# Altium footprint library SYB.PcbLib.PcbLib: 89 footprints (part 5 of 6)
Each footprint in its own frame and in the unit in brackets; x right, y up, seen from the top. Pads: shape width x height; smd on the part's side, far side on the other; paste and mask are expansions set on the pad; w line width, h text height; cw(c..) or ccw(c..) is an arc to the next point about the centre after c.
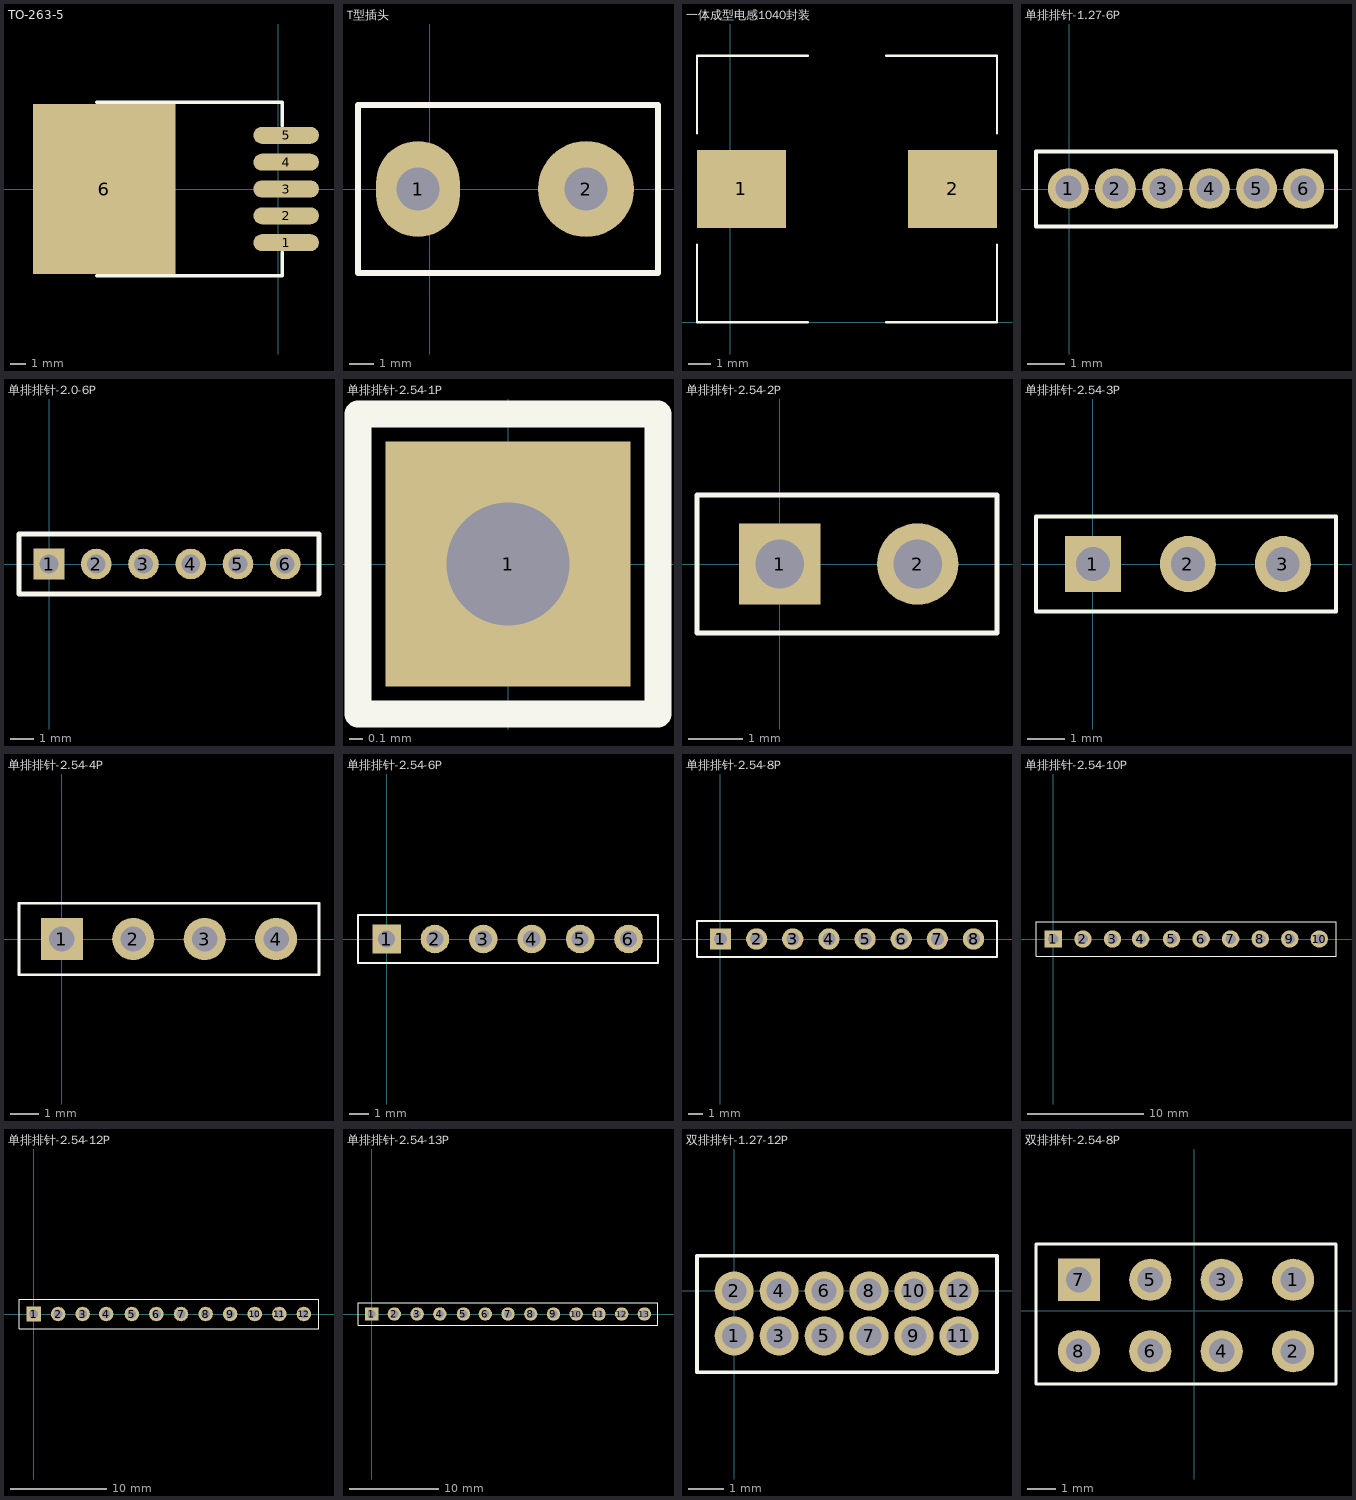
[diagram p4: the footprints below, top view; thin cyan lines are the x and y axes]

## TO-263-5 [mm] "TO-263-5"
pads (6):
  oval 4.16x1.07 smd: 1(0.5,-3.4) 2(0.5,-1.7) 3(0.5,0) 4(0.5,1.7) 5(0.5,3.4)
  rect 9x10.8 smd: 6(-11.025,0)
Top Overlay:
  lines w0.2: -11.5,-5.5 0.25,-5.5 0.25,-5.25 0.25,-4 ; -11.5,5.5 0.25,5.5 0.25,4
3D body: height 4.76, standoff 0.2, extent -13.57,-5.018 0.445,5.142

## T型插头 [mm]
pads (2):
  oval 3.5x4 hole 1.8: 1(-0.5,0)
  round 4 hole 1.8: 2(6.5,0)
Top Overlay:
  lines w0.254: -3,-3.5 -3,3.5 9.5,3.5 9.5,-3.5 -3,-3.5

## 一体成型电感1040封装 [mm]
pads (2):
  rect 4x3.5 smd: 1(0.5,6) 2(10,6)
Top Overlay:
  lines w0.1: -1.5,3.5 -1.5,0 0,0 3.5,0 ; -1.5,8.5 -1.5,12 3.5,12 ; 7,0 12,0 12,3.5 ; 7,12 10,12 12,12 12,8.5

## 单排排针-1.27-6P [mm]
pads (6):
  round 1.1 hole 0.7 unplated: 1(-0.025,0.025) 2(1.245,0.025) 3(2.515,0.025) 4(3.785,0.025) 5(5.055,0.025) 6(6.325,0.025)
Top Overlay:
  lines w0.1: -0.9,-1 7.2,-1 7.2,1.025 -0.9,1.025 -0.9,-1

## 单排排针-2.0-6P [mm]
pads (6):
  rect 1.3x1.3 hole 0.8: 1(0,0)
  round 1.3 hole 0.8: 2(2,0) 3(4,0) 4(6,0) 5(8,0) 6(10,0)
Top Overlay:
  lines w0.2: -1.27,-1.27 11.43,-1.27 11.43,1.27 -1.27,1.27 -1.27,-1.27

## 单排排针-2.54-1P [mm]
pads (1):
  rect 1.8x1.8 hole 0.9: 1(0,0)
Top Overlay:
  lines w0.2: -1.1,-1.1 -1.1,1.1 1.1,1.1 1.1,-1.1 -1.1,-1.1
3D body: height 8.54, standoff -3, extent -1.27,-1.27 1.27,1.27

## 单排排针-2.54-2P [mm]
pads (2):
  rect 1.5x1.5 hole 0.9 unplated: 1(0,0)
  round 1.5 hole 0.9 unplated: 2(2.54,0)
Top Overlay:
  lines w0.1: -1.524,-1.27 4,-1.27 4,1.27 -1.524,1.27 -1.524,-1.27

## 单排排针-2.54-3P [mm]
pads (3):
  rect 1.5x1.5 hole 0.9 unplated: 1(0,0)
  round 1.5 hole 0.9 unplated: 2(2.54,0) 3(5.08,0)
Top Overlay:
  lines w0.1: -1.524,-1.27 6.5,-1.27 6.5,1.27 -1.524,1.27 -1.524,-1.27

## 单排排针-2.54-4P [mm]
pads (4):
  rect 1.5x1.5 hole 0.9 unplated: 1(0,0)
  round 1.5 hole 0.9 unplated: 2(2.54,0) 3(5.08,0) 4(7.62,0)
Top Overlay:
  lines w0.1: -1.524,-1.27 -1.524,1.27 9.144,1.27 9.144,-1.27 -1.524,-1.27

## 单排排针-2.54-6P [mm]
pads (6):
  rect 1.5x1.5 hole 0.9 unplated: 1(0,0)
  round 1.5 hole 0.9 unplated: 2(2.54,0) 3(5.08,0) 4(7.62,0)
  round 1.5 hole 0.9: 5(10.16,0) 6(12.7,0)
Top Overlay:
  lines w0.1: -1.5,-1.27 14.25,-1.27 14.25,1.27 -1.5,1.27 -1.5,-1.27

## 单排排针-2.54-8P [mm]
pads (8):
  rect 1.5x1.5 hole 0.9: 1(0,0)
  round 1.5 hole 0.9: 2(2.54,0) 3(5.08,0) 4(7.62,0) 5(10.16,0) 6(12.7,0) 7(15.24,0) 8(17.78,0)
Top Overlay:
  lines w0.127: -1.651,-1.27 -1.651,1.27 19.431,1.27 19.431,-1.27 -1.651,-1.27

## 单排排针-2.54-10P [mm]
pads (10):
  rect 1.5x1.5 hole 0.9: 1(0,0)
  round 1.5 hole 0.9: 2(2.54,0) 3(5.08,0) 4(7.5,0) 5(10.16,0) 6(12.7,0) 7(15.24,0) 8(17.78,0) 9(20.32,0) 10(22.86,0)
Top Overlay:
  lines w0.1: -1.5,-1.5 -1.5,1.5 24.3,1.5 24.3,-1.5 -1.5,-1.5

## 单排排针-2.54-12P [mm]
pads (12):
  rect 1.5x1.5 hole 0.9: 1(0,0)
  round 1.5 hole 0.9: 2(2.54,0) 3(5.08,0) 4(7.5,0) 5(10.16,0) 6(12.7,0) 7(15.24,0) 8(17.78,0) 9(20.32,0) 10(22.86,0) 11(25.4,0) 12(27.94,0)
Top Overlay:
  lines w0.1: -1.5,-1.5 -1.5,1.5 29.5,1.5 29.5,-1.5 -1.5,-1.5

## 单排排针-2.54-13P [mm]
pads (13):
  rect 1.5x1.5 hole 0.9 unplated: 1(0,0)
  round 1.5 hole 0.9 unplated: 2(2.54,0) 3(5.08,0) 4(7.62,0)
  round 1.5 hole 0.9: 5(10.26,0) 6(12.7,0) 7(15.24,0) 8(17.78,0) 9(20.32,0) 10(22.86,0) 11(25.4,0) 12(27.94,0) 13(30.48,0)
Top Overlay:
  lines w0.1: -1.524,-1.27 -1.524,1.27 32,1.27 32,-1.27 -1.524,-1.27

## 双排排针-1.27-12P [mm]
pads (12):
  round 1.1 hole 0.7 unplated: 1(0,-1.27) 2(0,0) 3(1.27,-1.27) 4(1.27,0) 5(2.54,-1.27) 6(2.54,0) 7(3.81,-1.27) 8(3.81,0) 9(5.08,-1.27) 10(5.08,0) 11(6.35,-1.27) 12(6.35,0)
Top Overlay:
  lines w0.1: -1.05,-2.3 -1.05,1 7.425,1 7.425,-2.3 -1.05,-2.3

## 双排排针-2.54-8P [mm]
pads (8):
  round 1.5 hole 0.9 unplated: 1(3.52,1.1) 2(3.52,-1.44) 3(0.98,1.1) 4(0.98,-1.44) 5(-1.56,1.1) 6(-1.56,-1.44) 8(-4.1,-1.44)
  rect 1.5x1.5 hole 0.9 unplated: 7(-4.1,1.1)
Top Overlay:
  lines w0.1: -5.624,-2.6 5.044,-2.6 5.044,2.37 -5.624,2.37 -5.624,-2.6